# Altium footprint library ref-packages-longpad.PCBLIB: 1527 footprints (part 100 of 103)
Each footprint in its own frame and in the unit in brackets; x right, y up, seen from the top. Pads: shape width x height; smd on the part's side, far side on the other; paste and mask are expansions set on the pad; w line width, h text height; cw(c..) or ccw(c..) is an arc to the next point about the centre after c.
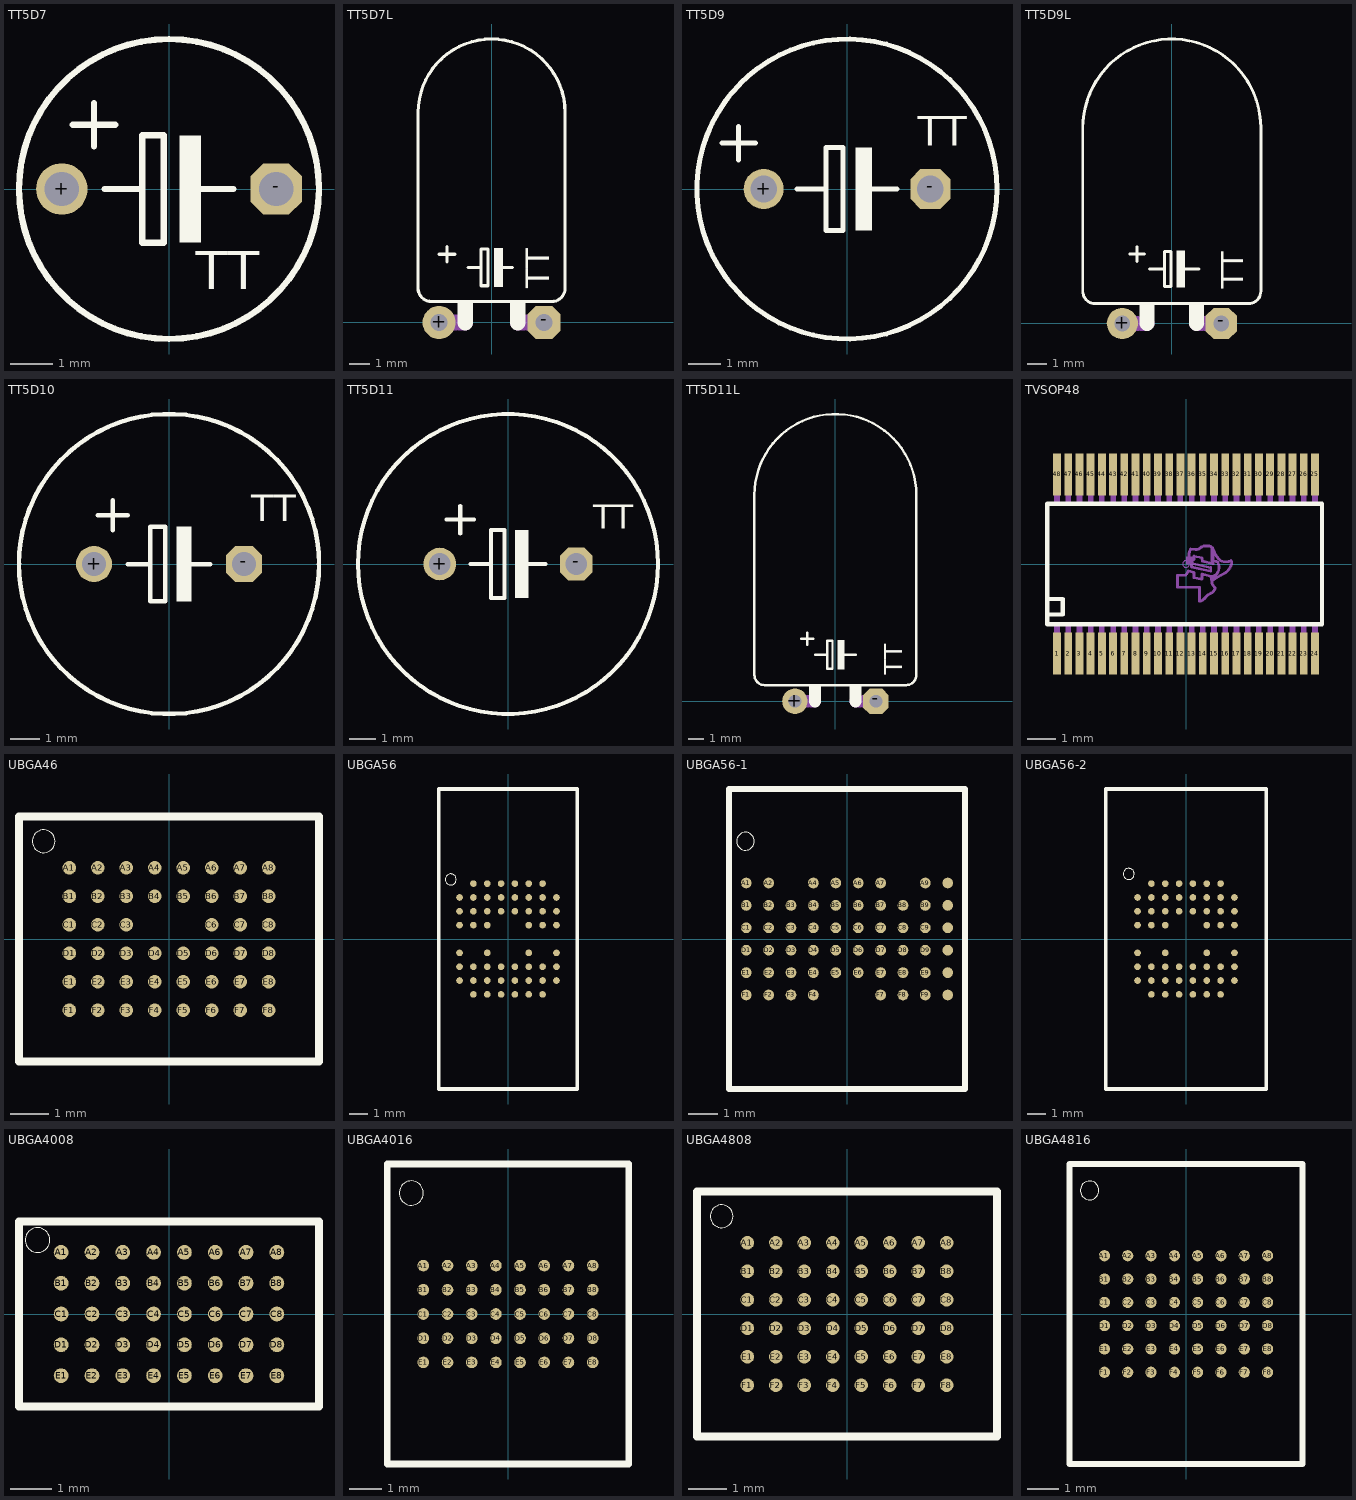
[diagram p99: the footprints below, top view; thin cyan lines are the x and y axes]

## TT5D7 [mil]
pads (2):
  round 48 hole 32: +(-100,0)
  oct 48x48 hole 32: -(100,0)
Top Overlay:
  circle w6: c0,0 r140
  rectangle: 10,-50 30,50
  lines w6: -90,60 -50,60 ; -70,40 -70,80 ; -60,0 -25,0 ; 25,0 60,0 ; -25,0 -25,-50 -5,-50 -5,50 -25,50 -25,0
  text "TT" at 25,-105 h60.45

## TT5D7L [mil]
pads (2):
  round 63 hole 32: +(-100,0)
  oct 63x63 hole 32: -(100,0)
Top Overlay:
  rectangle: -65,25 -35,40
  rectangle: 35,25 65,40
  rectangle: 5,68 22,142
  lines w6: -100,130 -70,130 ; -85,115 -85,145 ; -45,105 -20,105 ; 20,105 40,105 ; -20,105 -20,70 -7,70 -7,140 -20,140 -20,105 ; -140,65 -140,400 cw(c0,400) 140,400 140,65 cw(c115,65) 115,40 -115,40 cw(c-115,65) -140,65
  lines w30: -50,0 -50,25 ; 50,0 50,25
  text "TT" at 125,65 h77.5
Mechanical 16:
  rectangle: 65,-15 100,15
  rectangle: -100,-15 -65,15
  lines w30: -60,0 -50,0 ; 50,0 60,0

## TT5D9 [mil]
pads (2):
  round 48 hole 32: +(-100,0)
  oct 48x48 hole 32: -(100,0)
Top Overlay:
  circle w6: c0,0 r180
  rectangle: 10,-50 30,50
  lines w6: -150,55 -110,55 ; -130,35 -130,75 ; -60,0 -25,0 ; 25,0 60,0 ; -25,0 -25,-50 -5,-50 -5,50 -25,50 -25,0
  text "TT" at 85,40 h60.45

## TT5D9L [mil]
pads (2):
  round 63 hole 32: +(-100,0)
  oct 63x63 hole 32: -(100,0)
Top Overlay:
  rectangle: -65,25 -35,40
  rectangle: 35,25 65,40
  rectangle: 10,73 27,147
  lines w6: -85,140 -55,140 ; -70,125 -70,155 ; -45,110 -15,110 ; 25,110 55,110 ; -15,110 -15,75 -2,75 -2,145 -15,145 -15,110 ; -180,65 -180,395 cw(c0,395) 180,395 180,65 cw(c155,65) 155,40 -155,40 cw(c-155,65) -180,65
  lines w30: -50,0 -50,25 ; 50,0 50,25
  text "TT" at 160,70 h77.5
Mechanical 16:
  rectangle: 65,-15 100,15
  rectangle: -100,-15 -65,15
  lines w30: -60,0 -50,0 ; 50,0 60,0

## TT5D10 [mil]
pads (2):
  round 48 hole 32: +(-100,0)
  oct 48x48 hole 32: -(100,0)
Top Overlay:
  circle w6: c0,0 r200
  rectangle: 10,-50 30,50
  lines w6: -95,65 -55,65 ; -75,45 -75,85 ; -55,0 -25,0 ; 25,0 55,0 ; -25,0 -25,-50 -5,-50 -5,50 -25,50 -25,0
  text "TT" at 110,45 h60.45

## TT5D11 [mil]
pads (2):
  round 48 hole 32: +(-100,0)
  oct 48x48 hole 32: -(100,0)
Top Overlay:
  circle w6: c0,0 r220
  rectangle: 10,-50 30,50
  lines w6: -90,65 -50,65 ; -70,45 -70,85 ; -55,0 -25,0 ; 25,0 55,0 ; -25,0 -25,-50 -5,-50 -5,50 -25,50 -25,0
  text "TT" at 125,40 h60.45

## TT5D11L [mil]
pads (2):
  round 63 hole 32: +(-100,0)
  oct 63x63 hole 32: -(100,0)
Top Overlay:
  rectangle: -65,25 -35,40
  rectangle: 35,25 65,40
  rectangle: 5,78 22,152
  lines w6: -85,155 -55,155 ; -70,140 -70,170 ; -50,115 -20,115 ; 20,115 50,115 ; -20,115 -20,80 -7,80 -7,150 -20,150 -20,115 ; -200,65 -200,510 cw(c0,510) 200,510 200,65 cw(c175,65) 175,40 -175,40 cw(c-175,65) -200,65
  lines w30: -50,0 -50,25 ; 50,0 50,25
  text "TT" at 180,65 h77.5
Mechanical 16:
  rectangle: 65,-15 100,15
  rectangle: -100,-15 -65,15
  lines w30: -60,0 -50,0 ; 50,0 60,0

## TVSOP48 [mm]
pads (48):
  rect 0.28x1.5 smd: 1(-4.6,-3.2) 2(-4.2,-3.2) 3(-3.8,-3.2) 4(-3.4,-3.2) 5(-3,-3.2) 6(-2.6,-3.2) 7(-2.2,-3.2) 8(-1.8,-3.2) 9(-1.4,-3.2) 10(-1,-3.2) 11(-0.6,-3.2) 12(-0.2,-3.2) 13(0.2,-3.2) 14(0.6,-3.2) 15(1,-3.2) 16(1.4,-3.2) 17(1.8,-3.2) 18(2.2,-3.2) 19(2.6,-3.2) 20(3,-3.2) 21(3.4,-3.2) 22(3.8,-3.2) 23(4.2,-3.2) 24(4.6,-3.2) 25(4.6,3.2) 26(4.2,3.2) 27(3.8,3.2) 28(3.4,3.2) 29(3,3.2) 30(2.6,3.2) 31(2.2,3.2) 32(1.8,3.2) 33(1.4,3.2) 34(1,3.2) 35(0.6,3.2) 36(0.2,3.2) 37(-0.2,3.2) 38(-0.6,3.2) 39(-1,3.2) 40(-1.4,3.2) 41(-1.8,3.2) 42(-2.2,3.2) 43(-2.6,3.2) 44(-3,3.2) 45(-3.4,3.2) 46(-3.8,3.2) 47(-4.2,3.2) 48(-4.6,3.2)
Top Overlay:
  lines w0.152: -4.9,-1.25 -4.4,-1.25 -4.4,-1.8 -4.95,-1.8 ; -4.95,-1.8 -4.95,-2.15 4.85,-2.15 4.85,2.15 -4.95,2.15 -4.95,-1.8
Mechanical 16:
  drawing of 146 lines, arcs and shapes, not listed

## UBGA46 [mil]
pads (46):
  rrect100% 14.17x14.17 smd: A1(-103.35,73.82) A2(-73.82,73.82) A3(-44.29,73.82) A4(-14.76,73.82) A5(14.76,73.82) A6(44.29,73.82) A7(73.82,73.82) A8(103.35,73.82) B1(-103.35,44.29) B2(-73.82,44.29) B3(-44.29,44.29) B4(-14.76,44.29) B5(14.76,44.29) B6(44.29,44.29) B7(73.82,44.29) B8(103.35,44.29) C1(-103.35,14.76) C2(-73.82,14.76) C3(-44.29,14.76) C6(44.29,14.76) C7(73.82,14.76) C8(103.35,14.76) D1(-103.35,-14.76) D2(-73.82,-14.76) D3(-44.29,-14.76) D4(-14.76,-14.76) D5(14.76,-14.76) D6(44.29,-14.76) D7(73.82,-14.76) D8(103.35,-14.76) E1(-103.35,-44.29) E2(-73.82,-44.29) E3(-44.29,-44.29) E4(-14.76,-44.29) E5(14.76,-44.29) E6(44.29,-44.29) E7(73.82,-44.29) E8(103.35,-44.29) F1(-103.35,-73.82) F2(-73.82,-73.82) F3(-44.29,-73.82) F4(-14.76,-73.82) F5(14.76,-73.82) F6(44.29,-73.82) F7(73.82,-73.82) F8(103.35,-73.82)
Top Overlay:
  circle w0: c-129.92,101.38 r11.81
  lines w8: -155.51,-126.97 155.51,-126.97 155.51,126.97 -155.51,126.97 -155.51,-126.97

## UBGA56 [mm]
pads (54):
  rrect100% 0.36x0.36 smd: A2(-1.875,3) A3(-1.125,3) A4(-0.375,3) A5(0.375,3) A6(1.125,3) A7(1.875,3) B1(-2.625,2.25) B2(-1.875,2.25) B3(-1.125,2.25) B4(-0.375,2.25) B5(0.375,2.25) B6(1.125,2.25) B7(1.875,2.25) B8(2.625,2.25) C1(-2.625,1.5) C2(-1.875,1.5) C3(-1.125,1.5) C4(-0.375,1.5) C5(0.375,1.5) C6(1.125,1.5) C7(1.875,1.5) C8(2.625,1.5) D1(-2.625,0.75) D2(-1.875,0.75) D3(-1.125,0.75) D6(1.125,0.75) D7(1.875,0.75) D8(2.625,0.75) F1(-2.625,-0.75) F3(-1.125,-0.75) F6(1.125,-0.75) F8(2.625,-0.75) G1(-2.625,-1.5) G2(-1.875,-1.5) G3(-1.125,-1.5) G4(-0.375,-1.5) G5(0.375,-1.5) G6(1.125,-1.5) G7(1.875,-1.5) G8(2.625,-1.5) H1(-2.625,-2.25) H2(-1.875,-2.25) H3(-1.125,-2.25) H4(-0.375,-2.25) H5(0.375,-2.25) H6(1.125,-2.25) H7(1.875,-2.25) H8(2.625,-2.25) I2(-1.875,-3) I3(-1.125,-3) I4(-0.375,-3) I5(0.375,-3) I6(1.125,-3) I7(1.875,-3)
Top Overlay:
  circle w0: c-3.1,3.225 r0.3
  lines w0.203: -3.75,-8.125 3.75,-8.125 3.75,8.125 -3.75,8.125 -3.75,-8.125

## UBGA56-1 [mil]
pads (56):
  rrect100% 14.17x14.17 smd: A1(-132.87,73.82) A2(-103.35,73.82) A4(-44.29,73.82) A5(-14.76,73.82) A6(14.76,73.82) A7(44.29,73.82) A9(103.35,73.82) A10(132.87,73.82) B1(-132.87,44.29) B2(-103.35,44.29) B3(-73.82,44.29) B4(-44.29,44.29) B5(-14.76,44.29) B6(14.76,44.29) B7(44.29,44.29) B8(73.82,44.29) B9(103.35,44.29) B10(132.87,44.29) C1(-132.87,14.76) C2(-103.35,14.76) C3(-73.82,14.76) C4(-44.29,14.76) C5(-14.76,14.76) C6(14.76,14.76) C7(44.29,14.76) C8(73.82,14.76) C9(103.35,14.76) C10(132.87,14.76) D1(-132.87,-14.76) D2(-103.35,-14.76) D3(-73.82,-14.76) D4(-44.29,-14.76) D5(-14.76,-14.76) D6(14.76,-14.76) D7(44.29,-14.76) D8(73.82,-14.76) D9(103.35,-14.76) D10(132.87,-14.76) E1(-132.87,-44.29) E2(-103.35,-44.29) E3(-73.82,-44.29) E4(-44.29,-44.29) E5(-14.76,-44.29) E6(14.76,-44.29) E7(44.29,-44.29) E8(73.82,-44.29) E9(103.35,-44.29) E10(132.87,-44.29) F1(-132.87,-73.82) F2(-103.35,-73.82) F3(-73.82,-73.82) F4(-44.29,-73.82) F7(44.29,-73.82) F8(73.82,-73.82) F9(103.35,-73.82) F10(132.87,-73.82)
Top Overlay:
  circle w0: c-133.86,128.94 r11.81
  lines w8: -155.51,-197.83 155.51,-197.83 155.51,197.83 -155.51,197.83 -155.51,-197.83

## UBGA56-2 [mm]
pads (54):
  rrect100% 0.36x0.36 smd: A2(-1.875,3) A3(-1.125,3) A4(-0.375,3) A5(0.375,3) A6(1.125,3) A7(1.875,3) B1(-2.625,2.25) B2(-1.875,2.25) B3(-1.125,2.25) B4(-0.375,2.25) B5(0.375,2.25) B6(1.125,2.25) B7(1.875,2.25) B8(2.625,2.25) C1(-2.625,1.5) C2(-1.875,1.5) C3(-1.125,1.5) C4(-0.375,1.5) C5(0.375,1.5) C6(1.125,1.5) C7(1.875,1.5) C8(2.625,1.5) D1(-2.625,0.75) D2(-1.875,0.75) D3(-1.125,0.75) D6(1.125,0.75) D7(1.875,0.75) D8(2.625,0.75) F1(-2.625,-0.75) F3(-1.125,-0.75) F6(1.125,-0.75) F8(2.625,-0.75) G1(-2.625,-1.5) G2(-1.875,-1.5) G3(-1.125,-1.5) G4(-0.375,-1.5) G5(0.375,-1.5) G6(1.125,-1.5) G7(1.875,-1.5) G8(2.625,-1.5) H1(-2.625,-2.25) H2(-1.875,-2.25) H3(-1.125,-2.25) H4(-0.375,-2.25) H5(0.375,-2.25) H6(1.125,-2.25) H7(1.875,-2.25) H8(2.625,-2.25) I2(-1.875,-3) I3(-1.125,-3) I4(-0.375,-3) I5(0.375,-3) I6(1.125,-3) I7(1.875,-3)
Top Overlay:
  circle w0: c-3.1,3.525 r0.3
  lines w0.203: -4.35,-8.125 4.35,-8.125 4.35,8.125 -4.35,8.125 -4.35,-8.125

## UBGA4008 [mil]
pads (40):
  rrect100% 14.17x14.17 smd: A1(-103.35,59.06) A2(-73.82,59.06) A3(-44.29,59.06) A4(-14.76,59.06) A5(14.76,59.06) A6(44.29,59.06) A7(73.82,59.06) A8(103.35,59.06) B1(-103.35,29.53) B2(-73.82,29.53) B3(-44.29,29.53) B4(-14.76,29.53) B5(14.76,29.53) B6(44.29,29.53) B7(73.82,29.53) B8(103.35,29.53) C1(-103.35,0) C2(-73.82,0) C3(-44.29,0) C4(-14.76,0) C5(14.76,0) C6(44.29,0) C7(73.82,0) C8(103.35,0) D1(-103.35,-29.53) D2(-73.82,-29.53) D3(-44.29,-29.53) D4(-14.76,-29.53) D5(14.76,-29.53) D6(44.29,-29.53) D7(73.82,-29.53) D8(103.35,-29.53) E1(-103.35,-59.06) E2(-73.82,-59.06) E3(-44.29,-59.06) E4(-14.76,-59.06) E5(14.76,-59.06) E6(44.29,-59.06) E7(73.82,-59.06) E8(103.35,-59.06)
Top Overlay:
  circle w0: c-125.98,70.87 r11.81
  lines w8: -143.7,-88.58 143.7,-88.58 143.7,88.58 -143.7,88.58 -143.7,-88.58

## UBGA4016 [mil]
pads (40):
  rrect100% 14.17x14.17 smd: A1(-103.35,59.06) A2(-73.82,59.06) A3(-44.29,59.06) A4(-14.76,59.06) A5(14.76,59.06) A6(44.29,59.06) A7(73.82,59.06) A8(103.35,59.06) B1(-103.35,29.53) B2(-73.82,29.53) B3(-44.29,29.53) B4(-14.76,29.53) B5(14.76,29.53) B6(44.29,29.53) B7(73.82,29.53) B8(103.35,29.53) C1(-103.35,0) C2(-73.82,0) C3(-44.29,0) C4(-14.76,0) C5(14.76,0) C6(44.29,0) C7(73.82,0) C8(103.35,0) D1(-103.35,-29.53) D2(-73.82,-29.53) D3(-44.29,-29.53) D4(-14.76,-29.53) D5(14.76,-29.53) D6(44.29,-29.53) D7(73.82,-29.53) D8(103.35,-29.53) E1(-103.35,-59.06) E2(-73.82,-59.06) E3(-44.29,-59.06) E4(-14.76,-59.06) E5(14.76,-59.06) E6(44.29,-59.06) E7(73.82,-59.06) E8(103.35,-59.06)
Top Overlay:
  circle w0: c-118.11,147.64 r14.76
  lines w8: -147.64,-183.07 147.64,-183.07 147.64,183.07 -147.64,183.07 -147.64,-183.07

## UBGA4808 [mil]
pads (48):
  rrect100% 14.17x14.17 smd: A1(-103.35,73.82) A2(-73.82,73.82) A3(-44.29,73.82) A4(-14.76,73.82) A5(14.76,73.82) A6(44.29,73.82) A7(73.82,73.82) A8(103.35,73.82) B1(-103.35,44.29) B2(-73.82,44.29) B3(-44.29,44.29) B4(-14.76,44.29) B5(14.76,44.29) B6(44.29,44.29) B7(73.82,44.29) B8(103.35,44.29) C1(-103.35,14.76) C2(-73.82,14.76) C3(-44.29,14.76) C4(-14.76,14.76) C5(14.76,14.76) C6(44.29,14.76) C7(73.82,14.76) C8(103.35,14.76) D1(-103.35,-14.76) D2(-73.82,-14.76) D3(-44.29,-14.76) D4(-14.76,-14.76) D5(14.76,-14.76) D6(44.29,-14.76) D7(73.82,-14.76) D8(103.35,-14.76) E1(-103.35,-44.29) E2(-73.82,-44.29) E3(-44.29,-44.29) E4(-14.76,-44.29) E5(14.76,-44.29) E6(44.29,-44.29) E7(73.82,-44.29) E8(103.35,-44.29) F1(-103.35,-73.82) F2(-73.82,-73.82) F3(-44.29,-73.82) F4(-14.76,-73.82) F5(14.76,-73.82) F6(44.29,-73.82) F7(73.82,-73.82) F8(103.35,-73.82)
Top Overlay:
  circle w0: c-129.92,101.38 r11.81
  lines w8: -155.51,-126.97 155.51,-126.97 155.51,126.97 -155.51,126.97 -155.51,-126.97

## UBGA4816 [mil]
pads (48):
  rrect100% 14.17x14.17 smd: A1(-103.35,73.82) A2(-73.82,73.82) A3(-44.29,73.82) A4(-14.76,73.82) A5(14.76,73.82) A6(44.29,73.82) A7(73.82,73.82) A8(103.35,73.82) B1(-103.35,44.29) B2(-73.82,44.29) B3(-44.29,44.29) B4(-14.76,44.29) B5(14.76,44.29) B6(44.29,44.29) B7(73.82,44.29) B8(103.35,44.29) C1(-103.35,14.76) C2(-73.82,14.76) C3(-44.29,14.76) C4(-14.76,14.76) C5(14.76,14.76) C6(44.29,14.76) C7(73.82,14.76) C8(103.35,14.76) D1(-103.35,-14.76) D2(-73.82,-14.76) D3(-44.29,-14.76) D4(-14.76,-14.76) D5(14.76,-14.76) D6(44.29,-14.76) D7(73.82,-14.76) D8(103.35,-14.76) E1(-103.35,-44.29) E2(-73.82,-44.29) E3(-44.29,-44.29) E4(-14.76,-44.29) E5(14.76,-44.29) E6(44.29,-44.29) E7(73.82,-44.29) E8(103.35,-44.29) F1(-103.35,-73.82) F2(-73.82,-73.82) F3(-44.29,-73.82) F4(-14.76,-73.82) F5(14.76,-73.82) F6(44.29,-73.82) F7(73.82,-73.82) F8(103.35,-73.82)
Top Overlay:
  circle w0: c-122.05,156.5 r11.81
  lines w8: -147.64,-189.96 147.64,-189.96 147.64,189.96 -147.64,189.96 -147.64,-189.96